# Altium footprint library uC.PcbLib: 16 footprints
Each footprint in its own frame and in the unit in brackets; x right, y up, seen from the top. Pads: shape width x height; smd on the part's side, far side on the other; paste and mask are expansions set on the pad; w line width, h text height; cw(c..) or ccw(c..) is an arc to the next point about the centre after c.
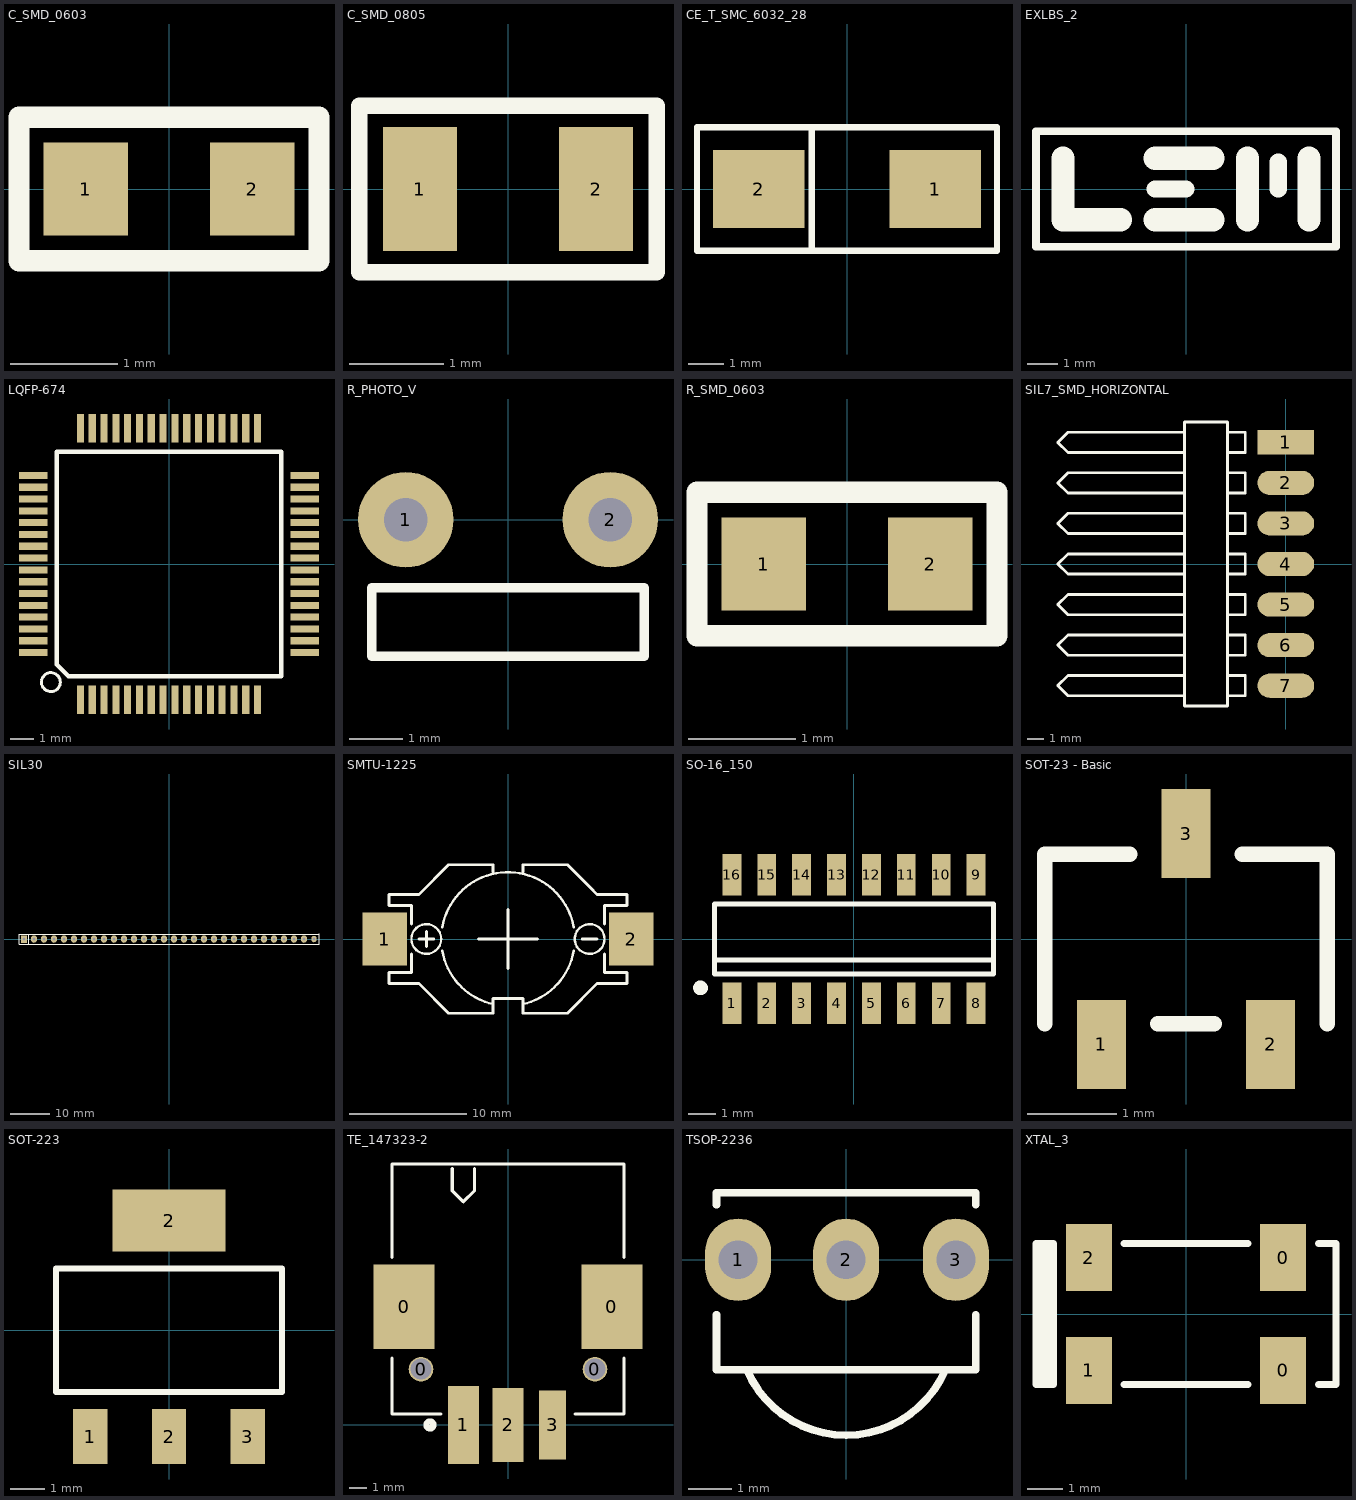
[diagram p0: the footprints below, top view; thin cyan lines are the x and y axes]

## C_SMD_0603 [mil]
pads (2):
  rect 31x34 smd: 1(-30.5,0) 2(30.5,0)
Top Overlay:
  lines w7.87: -55,-26.25 55,-26.25 55,26.25 -55,26.25 -55,-26.25
3D body "Cap_SMD_0603.SLDPRT": height 19.68, standoff 0, extent -30,-15 30,15

## C_SMD_0805 [mil]
pads (2):
  rect 31x52 smd: 1(-37,0) 2(37,0)
Top Overlay:
  lines w7: -62.5,-35 -62.5,35 62.5,35 62.5,-35 -62.5,-35
3D body "Cap_SMD_0805.SLDPRT": height 30, standoff 0, extent -39.99,-24.99 40.01,25

## CE_T_SMC_6032_28 [mm]
pads (2):
  rect 2.6x2.2 smd: 1(2.5,0) 2(-2.5,0)
Top Overlay:
  lines w0.178: -1,-1.75 -1,1.75 ; -4.25,-1.75 -4.25,1.75 4.25,1.75 4.25,-1.75 -4.25,-1.75
3D body "SMC_22uF_Tantal.STEP": height 2.84, standoff -0.01, extent -3,-1.6 3,1.6

## EXLBS_2 [mm]
Top Overlay:
  lines w0.254: -4.953,-1.905 4.953,-1.905 4.953,1.905 -4.953,1.905 -4.953,-1.905
  lines w0.572: -1.016,0 0,0 ; 3.048,0 3.048,0.889
  lines w0.762: -4.064,1.016 -4.064,-1.016 -2.159,-1.016 ; -1.016,-1.016 0.889,-1.016 ; -1.016,1.016 0.889,1.016 ; 2.032,-1.016 2.032,1.016 ; 4.064,-1.016 4.064,1.016

## LQFP-674 [mm]
pads (64):
  rect 0.3x1.2 smd mask+0.05: 1(-3.75,-5.75) 2(-3.25,-5.75) 3(-2.75,-5.75) 4(-2.25,-5.75) 5(-1.75,-5.75) 6(-1.25,-5.75) 7(-0.75,-5.75) 8(-0.25,-5.75) 9(0.25,-5.75) 10(0.75,-5.75) 11(1.25,-5.75) 12(1.75,-5.75) 13(2.25,-5.75) 14(2.75,-5.75) 15(3.25,-5.75) 16(3.75,-5.75) 33(3.75,5.75) 34(3.25,5.75) 35(2.75,5.75) 36(2.25,5.75) 37(1.75,5.75) 38(1.25,5.75) 39(0.75,5.75) 40(0.25,5.75) 41(-0.25,5.75) 42(-0.75,5.75) 43(-1.25,5.75) 44(-1.75,5.75) 45(-2.25,5.75) 46(-2.75,5.75) 47(-3.25,5.75) 48(-3.75,5.75)
  rect 1.2x0.3 smd mask+0.05: 17(5.75,-3.75) 18(5.75,-3.25) 19(5.75,-2.75) 20(5.75,-2.25) 21(5.75,-1.75) 22(5.75,-1.25) 23(5.75,-0.75) 24(5.75,-0.25) 25(5.75,0.25) 26(5.75,0.75) 27(5.75,1.25) 28(5.75,1.75) 29(5.75,2.25) 30(5.75,2.75) 31(5.75,3.25) 32(5.75,3.75) 49(-5.75,3.75) 50(-5.75,3.25) 51(-5.75,2.75) 52(-5.75,2.25) 53(-5.75,1.75) 54(-5.75,1.25) 55(-5.75,0.75) 56(-5.75,0.25) 57(-5.75,-0.25) 58(-5.75,-0.75) 59(-5.75,-1.25) 60(-5.75,-1.75) 61(-5.75,-2.25) 62(-5.75,-2.75) 63(-5.75,-3.25) 64(-5.75,-3.75)
Top Overlay:
  circle w0.127: c-5,-5 r0.4
  lines w0.178: -4.75,-4.25 -4.75,4.75 4.75,4.75 4.75,-4.75 -4.25,-4.75 -4.75,-4.25
3D body "STM32Fxxx -LQFP64 10mm x 10mm.STEP": height 1.6, standoff 0.01, extent -5.999,-5.999 5.999,5.999

## R_PHOTO_V [mil]
pads (2):
  round 70 hole 32: 1(-75,0) 2(75,0)
Top Overlay:
  lines w7: -100,-100 100,-100 100,-50 -100,-50 -100,-100
3D body "PhotoRes_5mm.STEP": height 177.17, standoff -78.74, extent -99.99,-98.42 100.01,15.75

## R_SMD_0603 [mil]
pads (2):
  rect 31x34 smd: 1(-30.5,0) 2(30.5,0)
Top Overlay:
  lines w7.87: -55,-26.25 -55,26.25 55,26.25 55,-26.25 -55,-26.25
3D body "Res_SMD_0603.SLDPRT": height 17.72, standoff 0, extent -31.5,-15.75 31.49,15.75

## SIL7_SMD_HORIZONTAL [mil]
pads (7):
  rect 140x60 smd: 1(0,300)
  oval 140x60 smd: 2(0,200) 3(0,100) 4(0,0) 5(0,-100) 6(0,-200) 7(0,-300)
Top Overlay:
  lines w7: -250,-325 -537.5,-325 -562.5,-300 -537.5,-275 -250,-275 ; -250,-225 -537.5,-225 -562.5,-200 -537.5,-175 -250,-175 ; -250,-125 -537.5,-125 -562.5,-100 -537.5,-75 -250,-75 ; -250,-25 -537.5,-25 -562.5,0 -537.5,25 -250,25 ; -250,75 -537.5,75 -562.5,100 -537.5,125 -250,125 ; -250,175 -537.5,175 -562.5,200 -537.5,225 -250,225 ; -250,275 -537.5,275 -562.5,300 -537.5,325 -250,325 ; -143.75,-325 -100,-325 -100,-275 -143.75,-275 ; -143.75,-225 -100,-225 -100,-175 -143.75,-175 ; -143.75,-125 -100,-125 -100,-75 -143.75,-75 ; -143.75,-25 -100,-25 -100,25 -143.75,25 ; -143.75,75 -100,75 -100,125 -143.75,125 ; -143.75,175 -100,175 -100,225 -143.75,225 ; -143.75,275 -100,275 -100,325 -143.75,325 ; -250,-350 -250,350 -143.75,350 -143.75,-350 -250,-350
3D body "7_Pin_SMD_Horiz.STEP": height 118.11, standoff 0, extent -564.96,-350 52.76,350

## SIL30 [mil]
pads (30):
  rect 60x75 hole 32: 1(-1450.11,-0.01)
  oval 60x75 hole 32: 2(-1350.11,-0.01) 3(-1250.11,-0.01) 4(-1150.11,-0.01) 5(-1050.11,-0.01) 6(-950.11,-0.01) 7(-850.11,-0.01) 8(-750.11,-0.01) 9(-650.11,-0.01) 10(-550.11,-0.01) 11(-450.11,-0.01) 12(-350.11,-0.01) 13(-250.11,-0.01) 14(-150.11,-0.01) 15(-50.11,-0.01) 16(50,0) 17(150,0) 18(250,0) 19(350,0) 20(450,0) 21(550,0) 22(650,0) 23(750,0) 24(850,0) 25(950,0) 26(1050,0) 27(1150,0) 28(1250,0) 29(1350,0)
  oval 50x65 hole 32: 30(1450,0)
Top Overlay:
  lines w7: -1400.11,-50.01 -1400.11,49.99 ; 1500.11,49.99 -1500.11,49.99 -1500.11,-50.01 1500.11,-50.01 1500.11,50.11
3D body "1pin_straight.STEP": height 308.74, standoff -118.11, extent 1399.91,-50.09 1500.11,50.11
3D body "1pin_straight.STEP": height 308.74, standoff -118.11, extent 1299.91,-50.09 1400.11,50.11
3D body "1pin_straight.STEP": height 308.74, standoff -118.11, extent 1199.91,-50.09 1300.11,50.11
3D body "1pin_straight.STEP": height 308.74, standoff -118.11, extent 1099.91,-50.09 1200.11,50.11
3D body "1pin_straight.STEP": height 308.74, standoff -118.11, extent 999.91,-50.09 1100.11,50.11
3D body "1pin_straight.STEP": height 308.74, standoff -118.11, extent 899.91,-50.09 1000.11,50.11
3D body "1pin_straight.STEP": height 308.74, standoff -118.11, extent 799.91,-50.09 900.11,50.11
3D body "1pin_straight.STEP": height 308.74, standoff -118.11, extent 699.91,-50.09 800.11,50.11
3D body "1pin_straight.STEP": height 308.74, standoff -118.11, extent 599.91,-50.09 700.11,50.11
3D body "1pin_straight.STEP": height 308.74, standoff -118.11, extent 499.91,-50.09 600.11,50.11
3D body "1pin_straight.STEP": height 308.74, standoff -118.11, extent 399.91,-50.09 500.11,50.11
3D body "1pin_straight.STEP": height 308.74, standoff -118.11, extent 200,-50.2 300.2,50
3D body "1pin_straight.STEP": height 308.74, standoff -118.11, extent 99.9,-50.2 200.1,50
3D body "1pin_straight.STEP": height 308.74, standoff -118.11, extent -0.09,-50.09 100.11,50.11
3D body "1pin_straight.STEP": height 308.74, standoff -118.11, extent -100.2,-50.1 0,50.1
3D body "1pin_straight.STEP": height 308.74, standoff -118.11, extent -200.2,-50.1 -100,50.1
3D body "1pin_straight.STEP": height 308.74, standoff -118.11, extent -300.2,-50.1 -200,50.1
3D body "1pin_straight.STEP": height 308.74, standoff -118.11, extent -400.2,-50.1 -300,50.1
3D body "1pin_straight.STEP": height 308.74, standoff -118.11, extent -500.2,-50.1 -400,50.1
3D body "1pin_straight.STEP": height 308.74, standoff -118.11, extent -600.2,-50.1 -500,50.1
3D body "1pin_straight.STEP": height 308.74, standoff -118.11, extent -700.2,-50.1 -600,50.1
3D body "1pin_straight.STEP": height 308.74, standoff -118.11, extent -800.2,-50.1 -700,50.1
3D body "1pin_straight.STEP": height 308.74, standoff -118.11, extent -900.2,-50.1 -800,50.1
3D body "1pin_straight.STEP": height 308.74, standoff -118.11, extent -1000.2,-50.1 -900,50.1
3D body "1pin_straight.STEP": height 308.74, standoff -118.11, extent -1100.2,-50.1 -1000,50.1
3D body "1pin_straight.STEP": height 308.74, standoff -118.11, extent -1200.2,-50.1 -1100,50.1
3D body "1pin_straight.STEP": height 308.74, standoff -118.11, extent -1300.2,-50.1 -1200,50.1
3D body "1pin_straight.STEP": height 308.74, standoff -118.11, extent -1400.2,-50.1 -1300,50.1
3D body "1pin_straight.STEP": height 308.74, standoff -118.11, extent -1500.2,-50.1 -1400,50.1
3D body "1pin_straight.STEP": height 308.74, standoff -118.11, extent 300,-50.2 400.2,50

## SMTU-1225 [mil]
pads (2):
  rect 150x180 smd: 1(-415,0) 2(415,0)
Top Overlay:
  circle w8: c-275,0 r50
  circle w8: c275,0 r50
  lines w8: -221.58,-39.07 ccw(c0,0) -48.81,-219.64 ; -221.58,39.07 cw(c0,0) 221.58,39.07 ; 48.81,-219.64 ccw(c0,0) 221.58,-39.07
  lines w10: -325,-50 -325,-112.5 -400,-112.5 -400,-150 -300,-150 -200,-250 -50,-250 -50,-200 50,-200 50,-250 200,-250 300,-150 400,-150 400,-112.5 325,-112.5 325,-50 ; -325,50 -325,112.5 -400,112.5 -400,150 -300,150 -200,250 -50,250 -50,225 ; -300,0 -250,0 ; -275,-25 -275,25 ; -100,0 100,0 ; 0,-100 0,100 ; 50,225 50,250 200,250 275,175 300,150 400,150 400,112.5 325,112.5 325,50 ; 250,0 300,0
3D body "smtu1225.STEP": height 194.09, standoff 0, extent -463.35,-238.6 463.34,246.46

## SO-16_150 [mil]
pads (16):
  rect 27x60 smd mask+1.97: 1(-175,-92) 2(-125,-92) 3(-75,-92) 4(-25,-92) 5(25,-92) 6(75,-92) 7(125,-92) 8(175,-92) 9(175,92) 10(125,92) 11(75,92) 12(25,92) 13(-25,92) 14(-75,92) 15(-125,92) 16(-175,92)
Top Overlay:
  circle w11: c-220,-70 r5
  lines w7: -200,-30 200,-30 ; -200,-50 200,-50 200,50 -200,50 -200,-50
3D body "SOIC-16.STEP": height 55.12, standoff 0, extent -194.88,-118.11 194.89,118.11

## SOT-23 - Basic [mm]
pads (3):
  rect 0.55x1 smd: 1(-0.95,-1.185) 2(0.95,-1.185) 3(0,1.185)
Top Overlay:
  lines w0.178: -1.587,-0.953 -1.587,0.953 -0.635,0.953 ; -0.318,-0.953 0.318,-0.953 ; 0.635,0.953 1.587,0.953 1.587,-0.953
3D body "SOT-23.STEP": height 1.08, standoff -0.02, extent -1.5,-1.146 1.5,1.154

## SOT-223 [mm]
pads (4):
  rect 1x1.6 smd mask+0.08: 1(-2.3,-3.1) 2(0,-3.1) 3(2.3,-3.1)
  rect 3.3x1.8 smd mask+0.08: 2(0,3.2)
Top Overlay:
  lines w0.178: -3.3,-1.8 3.3,-1.8 3.3,1.8 -3.3,1.8 -3.3,-1.8
3D body "SOT-223.STEP": height 1.66, standoff -0.02, extent -3.25,-3.38 3.25,3.58

## TE_147323-2 [mil]
pads (7):
  rect 136x190 smd: 0(-233,265) 0(233,265)
  round 55 / inner round 65 / far side round 100 hole 47.24: 0(-195,125) 0(195,125)
  rect 70x175 smd: 1(-100,0)
  rect 70x165 smd: 2(0,0)
  rect 60x155 smd: 3(100,0)
Top Overlay:
  circle w13.78: c-175,0 r7.87
  lines w7: -260,150 -260,25 -150,25 ; -260,375 -260,585 260,585 260,375 ; -125,575 -125,525 -100,500 -75,525 -75,575 ; 150,25 260,25 260,150
3D body "147323-2_3pin.STEP": height 290.84, standoff -37.98, extent -263.52,-75 263.52,580.12

## TSOP-2236 [mm]
pads (3):
  oval 1.524x1.905 hole 0.9: 1(-2.5,0) 2(0,0) 3(2.54,0)
Top Overlay:
  lines w0.178: -3,-1.27 -3,-2.55 3,-2.55 3,-1.27 ; -3,1.27 -3,1.55 3,1.55 3,1.27 ; -2.297,-2.55 ccw(c0,-1.562) 2.297,-2.55
3D body "TSOP-4836_short.STEP": height 10.38, standoff -3.57, extent -3,-4.246 3,1.554

## XTAL_3 [mm]
pads (4):
  rect 1.3x1.9 smd mask+0.08: 0(2.75,-1.6) 0(2.75,1.6) 1(-2.75,-1.6) 2(-2.75,1.6)
Top Overlay:
  rectangle: -4.25,-2 -3.75,2
  lines w0.203: -1.75,-2 1.75,-2 ; -1.75,2 1.75,2 ; 3.75,-2 4.25,-2 4.25,2 3.75,2 ; -4.25,-2 -3.75,-2 -3.75,2 -4.25,2 -4.25,-2
3D body "ABS25.STEP": height 2.65, standoff 0, extent -4.2,-2.05 4.2,2.05